# Altium schematic symbol library FPGA_Xilinx_Virtex6.SchLib: 28 symbols (part 8 of 21) (continued)
## XC6VLX75T-FF784 (continued)
part F pins: AA3 MGTREFCLK0N_114 (io), AA4 MGTREFCLK0P_114 (io), AB1 MGTTXP2_114 (io), AB2 MGTTXN2_114 (io), AC3 MGTRXP3_114 (io), AC4 MGTRXN3_114 (io), AD1 MGTTXP1_114 (io), AD2 MGTTXN1_114 (io), AE3 MGTRXP2_114 (io), AE4 MGTRXN2_114 (io), AF1 MGTTXP0_114 (io), AF2 MGTTXN0_114 (io), AG3 MGTRXP1_114 (io), AG4 MGTRXN1_114 (io), AH1 MGTRXP0_114 (io), AH2 MGTRXN0_114 (io), L3 MGTRXP3_115 (io), L4 MGTRXN3_115 (io), M1 MGTTXP3_115 (io), M2 MGTTXN3_115 (io), N3 MGTRXP2_115 (io), N4 MGTRXN2_115 (io), P1 MGTTXP2_115 (io), P2 MGTTXN2_115 (io), P5 MGTREFCLK1N_115 (io), P6 MGTREFCLK1P_115 (io), R3 MGTRXP1_115 (io), R4 MGTRXN1_115 (io), T1 MGTTXP1_115 (io), T2 MGTTXN1_115 (io), T5 MGTREFCLK0N_115 (io), T6 MGTREFCLK0P_115 (io), U3 MGTRXP0_115 (io), U4 MGTRXN0_115 (io), V1 MGTTXP0_115 (io), V2 MGTTXN0_115 (io), W3 MGTREFCLK1N_114 (io), W4 MGTREFCLK1P_114 (io), Y1 MGTTXP3_114 (io), Y2 MGTTXN3_114 (io)
part G pins: A3 MGTRXP3_116 (io), A4 MGTRXN3_116 (io), B1 MGTRXP2_116 (io), B2 MGTRXN2_116 (io), C3 MGTRXP1_116 (io), C4 MGTRXN1_116 (io), D1 MGTTXP3_116 (io), D2 MGTTXN3_116 (io), E3 MGTRXP0_116 (io), E4 MGTRXN0_116 (io), F1 MGTTXP2_116 (io), F2 MGTTXN2_116 (io), G3 MGTREFCLK1N_116 (io), G4 MGTREFCLK1P_116 (io), H1 MGTTXP1_116 (io), H2 MGTTXN1_116 (io), J3 MGTREFCLK0N_116 (io), J4 MGTREFCLK0P_116 (io), K1 MGTTXP0_116 (io), K2 MGTTXN0_116 (io)
part H pins: A5 MGTAVTTRCAL_115 (power), AB4 MGTAVCC (power), AC2 MGTAVTT (power), AE2 MGTAVTT (power), AF4 MGTAVCC (power), AG2 MGTAVTT (power), AH4 MGTAVCC (power), B5 MGTRREF_115 (power), C2 MGTAVTT (power), D4 MGTAVCC (power), E2 MGTAVTT (power), F4 MGTAVCC (power), K4 MGTAVCC (power), L2 MGTAVTT (power), M4 MGTAVCC (power), N2 MGTAVTT (power), P4 MGTAVCC (power), R2 MGTAVTT (power), U2 MGTAVTT (power), V4 MGTAVCC (power), Y4 MGTAVCC (power)
part I pins: AA6 TDI_0 (io), AB6 TCK_0 (io), AF6 DOUT_BUSY_0 (io), AG6 CSI_B_0 (io), AH6 CCLK_0 (io), C6 M2_0 (io), D6 M1_0 (io), F6 M0_0 (io), G6 RDWR_B_0 (io), H6 DIN_0 (io), L6 DONE_0 (io), M6 INIT_B_0 (io), M7 PROGRAM_B_0 (io), N7 HSWAPEN_0 (io), P13 VREFN_0 (io), P14 VP_0 (io), R13 VN_0 (io), R14 VREFP_0 (io), T13 DXN_0 (io), T14 DXP_0 (io), W7 VCCO_0 (power), Y6 TMS_0 (io), Y7 TDO_0 (io), Y8 VCCO_0 (power)
part J pins: A1 GND (power), A2 GND (power), A6 GND (power), A8 GND (power), A18 GND (power), A28 GND (power), AD6 VFS_0 (power), B3 GND (power), B4 GND (power), B6 GND (power), B15 GND (power), B25 GND (power), C1 GND (power), C5 GND (power), C12 GND (power), C22 GND (power), D3 GND (power), D5 GND (power), D9 GND (power), D19 GND (power), E1 GND (power), E5 GND (power), E6 GND (power), E16 GND (power), E26 GND (power), F3 GND (power), F5 GND (power), F13 GND (power), F23 GND (power), G1 GND (power), G2 GND (power), G5 GND (power), G10 GND (power), G20 GND (power), H3 GND (power), H4 GND (power), H5 GND (power), H7 GND (power), H17 GND (power), H27 GND (power), J1 GND (power), J2 GND (power), J5 GND (power), J6 VBATT_0 (power), J14 GND (power), J24 GND (power), K3 GND (power), K5 GND (power), K6 GND (power), K8 VCCAUX (power), K11 GND (power), K12 VCCINT (power), K14 VCCINT (power), K16 VCCINT (power), K20 VCCAUX (power), K21 GND (power), L1 GND (power), L5 GND (power), L8 GND (power), L9 VCCINT (power), L10 GND (power), L11 VCCINT (power), L12 GND (power), L13 VCCINT (power), L14 GND (power), L15 VCCINT (power), L16 GND (power), L17 VCCINT (power), L18 GND (power), L19 VCCAUX (power), L28 GND (power), M3 GND (power), M5 GND (power), M8 VCCAUX (power), M9 GND (power), M10 VCCINT (power), M11 GND (power), M12 VCCINT (power), M13 GND (power), M14 VCCINT (power), M15 GND (power), M16 VCCINT (power), M17 GND (power), M18 VCCINT (power), M25 GND (power), N1 GND (power), N5 GND (power), N6 GND (power), N8 GND (power), N9 VCCINT (power), N10 GND (power), N11 VCCINT (power), N12 GND (power), N13 AVSS_0 (power), N14 AVDD_0 (power), N15 VCCINT (power), N16 GND (power), N17 VCCINT (power), N18 GND (power), N19 VCCAUX (power), N22 GND (power), P3 GND (power), P7 GND (power), P8 VCCAUX (power), P9 GND (power), P10 VCCINT (power), P11 GND (power), P12 VCCINT (power), P15 GND (power), P16 VCCINT (power), P17 GND (power), P18 VCCINT (power), P19 GND (power), R1 GND (power), R5 GND (power), R6 GND (power), R7 GND (power), R8 GND (power), R9 VCCINT (power), R10 GND (power), R11 VCCINT (power), R12 GND (power), R15 VCCINT (power), R16 GND (power), R17 VCCINT (power), R18 GND (power), R19 VCCAUX (power), R26 GND (power), T3 GND (power), T4 GND (power), T7 GND (power), T8 VCCAUX (power), T9 GND (power), T10 VCCINT (power), T11 GND (power), T12 VCCINT (power), T15 GND (power), T16 VCCINT (power), T17 GND (power), T18 VCCINT (power), T19 GND (power), T20 VCCAUX (power), U9 VCCAUX (power), U11 VCCINT (power), U13 VCCINT (power), U15 VCCINT (power), U17 VCCINT (power), U19 VCCAUX (power), V8 VCCAUX (power), V10 VCCINT (power), V12 VCCINT (power), V14 VCCINT (power), V16 VCCINT (power), V18 VCCINT (power), W13 VCCINT (power), W15 VCCINT (power), W17 VCCINT (power), W20 VCCAUX (power)
part K pins: AA1 GND (power), AA2 GND (power), AA5 GND (power), AA8 GND (power), AA18 GND (power), AA28 GND (power), AB3 GND (power), AB5 GND (power), AB15 GND (power), AB25 GND (power), AC1 GND (power), AC5 GND (power), AC6 GND (power), AC12 GND (power), AC22 GND (power), AD3 GND (power), AD4 GND (power), AD5 GND (power), AD9 GND (power), AD19 GND (power), AE1 GND (power), AE5 GND (power), AE6 GND (power), AE16 GND (power), AE26 GND (power), AF3 GND (power), AF5 GND (power), AF13 GND (power), AF23 GND (power), AG1 GND (power), AG5 GND (power), AG10 GND (power), AG20 GND (power), AH3 GND (power), AH5 GND (power), AH7 GND (power), AH17 GND (power), AH27 GND (power), T23 GND (power), U1 GND (power), U5 GND (power), U6 GND (power), U7 GND (power), U8 GND (power), U10 GND (power), U12 GND (power), U14 GND (power), U16 GND (power), U18 GND (power), U20 GND (power), V3 GND (power), V5 GND (power), V6 GND (power), V7 GND (power), V9 GND (power), V11 GND (power), V13 GND (power), V15 GND (power), V17 GND (power), V27 GND (power), W1 GND (power), W2 GND (power), W5 GND (power), W6 GND (power), W14 GND (power), W24 GND (power), Y3 GND (power), Y5 GND (power), Y11 GND (power), Y21 GND (power)

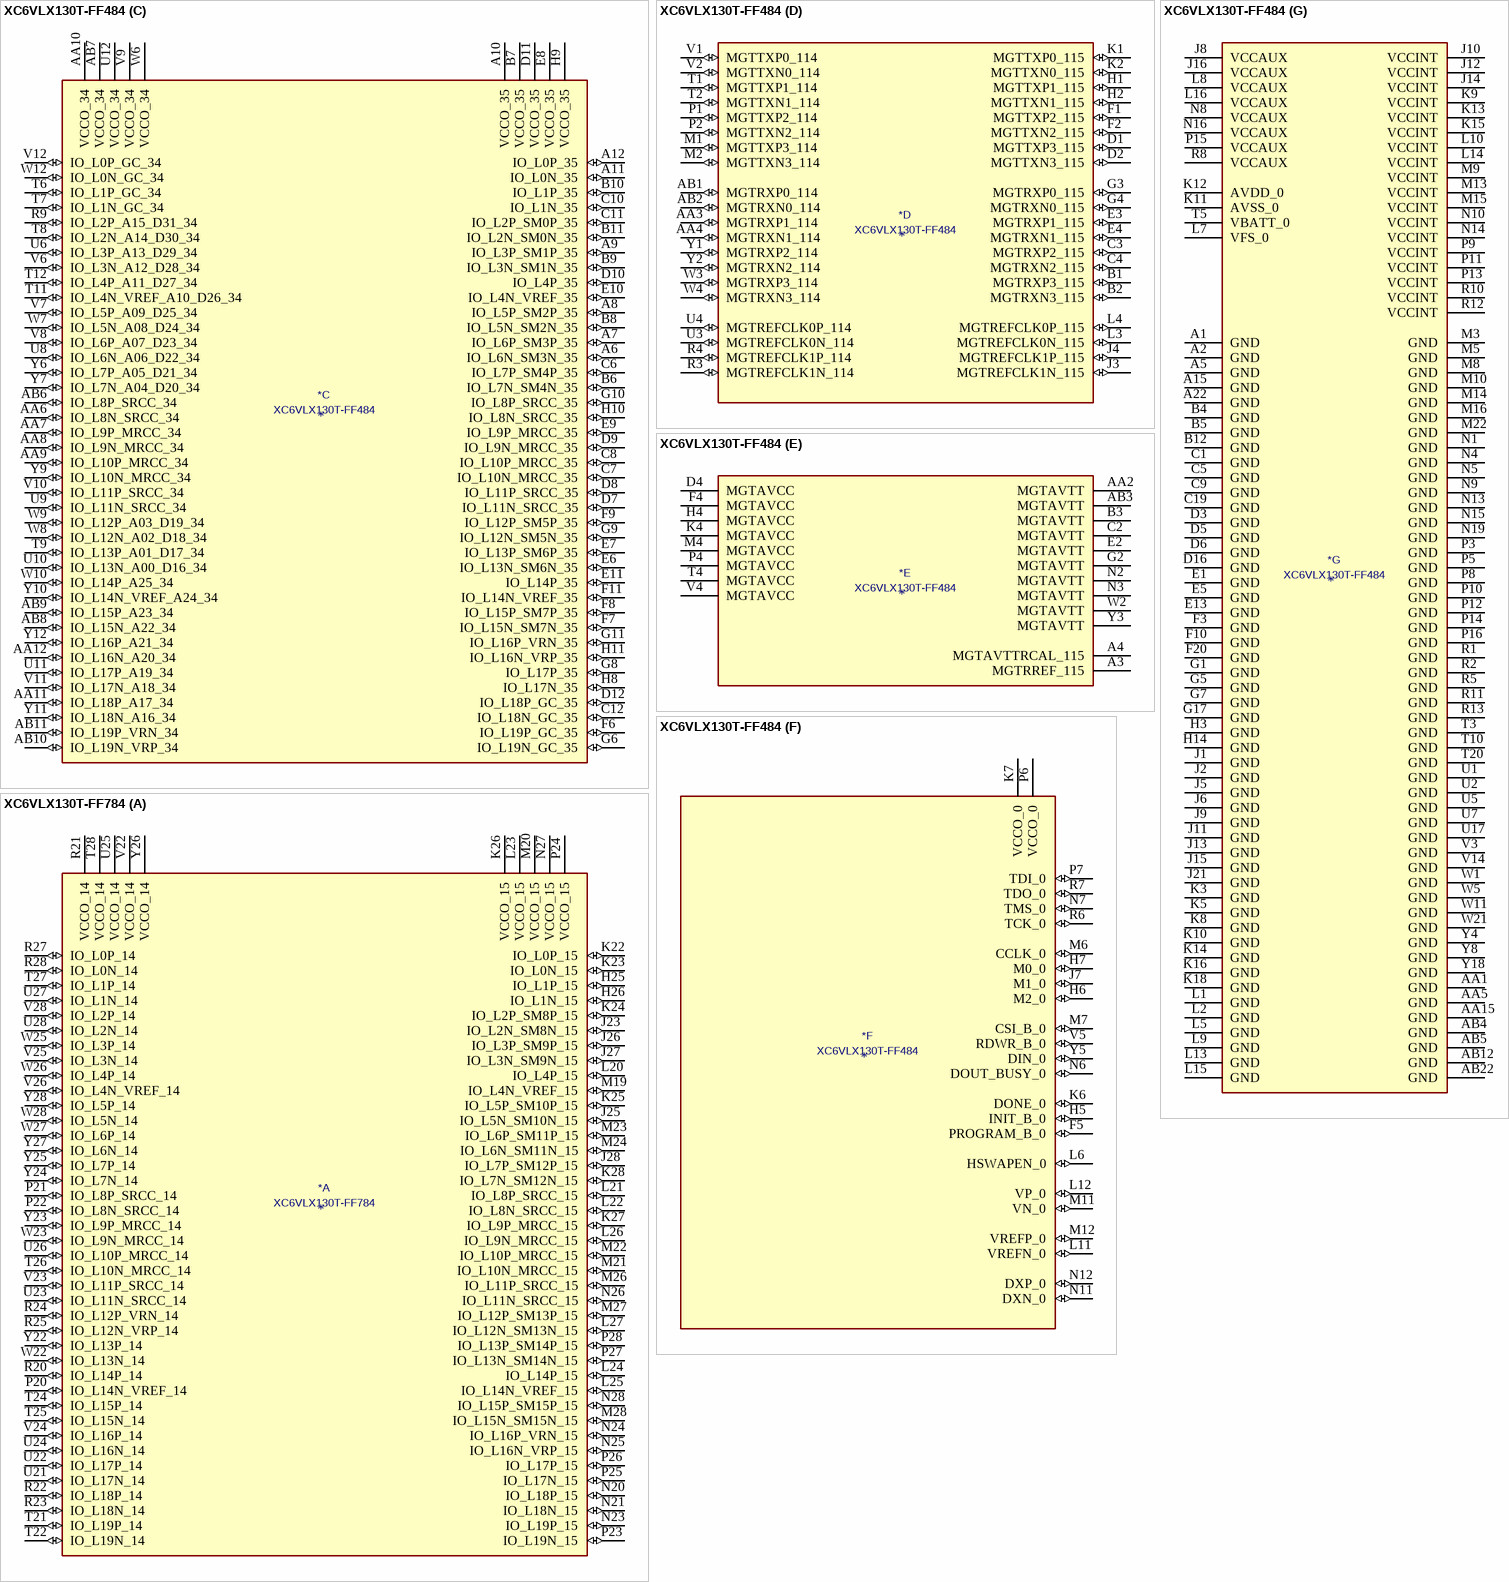
[diagram p38: symbols XC6VLX130T-FF484 to XC6VLX130T-FF784]

## XC6VLX130T-FF484
designator *  value XC6VLX130T-FF484
ki_keywords: FPGA; ki_description: Virtex 6 LXT 130 XC6VLX130T-FF484
part A pins: A20 VCCO_15 (power), A21 IO_L2P_SM8P_15 (io), AA20 VCCO_14 (power), AA21 IO_L15P_14 (io), AA22 IO_L14N_VREF_14 (io), AB20 IO_L16P_14 (io), AB21 IO_L16N_14 (io), B20 IO_L0P_15 (io), B21 IO_L2N_SM8N_15 (io), B22 IO_L5P_SM10P_15 (io), C20 IO_L0N_15 (io), C21 IO_L5N_SM10N_15 (io), C22 IO_L10P_MRCC_15 (io), D19 IO_L7N_SM12N_15 (io), D20 IO_L9P_MRCC_15 (io), D21 VCCO_15 (power), D22 IO_L10N_MRCC_15 (io), E19 IO_L7P_SM12P_15 (io), E20 IO_L9N_MRCC_15 (io), E21 IO_L11P_SRCC_15 (io), E22 IO_L11N_SRCC_15 (io), F18 IO_L1N_15 (io), F19 IO_L3N_SM9N_15 (io), F21 IO_L12P_SM13P_15 (io), F22 IO_L12N_SM13N_15 (io), G18 IO_L1P_15 (io), G19 IO_L3P_SM9P_15 (io), G20 IO_L17N_15 (io), G21 IO_L15P_SM15P_15 (io), G22 VCCO_15 (power), H17 IO_L14P_15 (io), H18 IO_L14N_VREF_15 (io), H19 VCCO_15 (power), H20 IO_L17P_15 (io), H21 IO_L15N_SM15N_15 (io), H22 IO_L18N_15 (io), J17 IO_L4N_VREF_15 (io), J18 IO_L4P_15 (io), J19 IO_L8N_SRCC_15 (io), J20 IO_L13P_SM14P_15 (io), J22 IO_L18P_15 (io), K17 IO_L6P_SM11P_15 (io), K19 IO_L8P_SRCC_15 (io), K20 IO_L13N_SM14N_15 (io), K21 IO_L19P_15 (io), K22 IO_L19N_15 (io), L17 IO_L6N_SM11N_15 (io), L18 IO_L16P_VRN_15 (io), L19 IO_L16N_VRP_15 (io), L20 VCCO_15 (power), L21 IO_L3N_14 (io), L22 IO_L3P_14 (io), M17 VCCO_14 (power), M18 IO_L0P_14 (io), M19 IO_L1N_14 (io), M20 IO_L1P_14 (io), M21 IO_L7P_14 (io), N17 IO_L6P_14 (io), N18 IO_L0N_14 (io), N20 IO_L7N_14 (io), N21 IO_L2N_14 (io), N22 IO_L2P_14 (io), P17 IO_L6N_14 (io), P18 IO_L12P_VRN_14 (io), P19 IO_L9P_MRCC_14 (io), P20 IO_L9N_MRCC_14 (io), P21 VCCO_14 (power), P22 IO_L4P_14 (io), R17 IO_L12N_VRP_14 (io), R18 VCCO_14 (power), R19 IO_L11P_SRCC_14 (io), R20 IO_L11N_SRCC_14 (io), R21 IO_L5P_14 (io), R22 IO_L4N_VREF_14 (io), T18 IO_L17P_14 (io), T19 IO_L17N_14 (io), T21 IO_L8N_SRCC_14 (io), T22 IO_L5N_14 (io), U19 IO_L13P_14 (io), U20 IO_L13N_14 (io), U21 IO_L8P_SRCC_14 (io), U22 VCCO_14 (power), V20 IO_L19P_14 (io), V21 IO_L19N_14 (io), V22 IO_L10N_MRCC_14 (io), W20 IO_L18N_14 (io), W22 IO_L10P_MRCC_14 (io), Y20 IO_L18P_14 (io), Y21 IO_L15N_14 (io), Y22 IO_L14P_14 (io)
part B pins: A13 IO_L12P_25 (io), A14 IO_L2P_25 (io), A16 IO_L5P_25 (io), A17 IO_L7P_25 (io), A18 IO_L7N_25 (io), A19 IO_L10P_MRCC_25 (io), AA13 IO_L16N_CSO_B_24 (io), AA14 IO_L18N_24 (io), AA16 IO_L11P_SRCC_24 (io), AA17 IO_L10N_MRCC_24 (io), AA18 IO_L8N_SRCC_24 (io), AA19 IO_L9P_MRCC_24 (io), AB13 IO_L16P_RS0_24 (io), AB14 IO_L18P_24 (io), AB15 IO_L19P_24 (io), AB16 IO_L19N_24 (io), AB17 VCCO_24 (power), AB18 IO_L8P_SRCC_24 (io), AB19 IO_L9N_MRCC_24 (io), B13 IO_L12N_25 (io), B14 IO_L2N_25 (io), B15 IO_L1P_25 (io), B16 IO_L5N_25 (io), B17 VCCO_25 (power), B18 IO_L13P_25 (io), B19 IO_L10N_MRCC_25 (io), C13 IO_L8P_SRCC_25 (io), C14 VCCO_25 (power), C15 IO_L1N_25 (io), C16 IO_L11P_SRCC_25 (io), C17 IO_L11N_SRCC_25 (io), C18 IO_L13N_25 (io), D13 IO_L8N_SRCC_25 (io), D14 IO_L0P_25 (io), D15 IO_L3P_25 (io), D17 IO_L17P_25 (io), D18 IO_L17N_25 (io), E12 IO_L6N_25 (io), E14 IO_L0N_25 (io), E15 IO_L3N_25 (io), E16 IO_L9P_MRCC_25 (io), E17 IO_L19P_GC_25 (io), E18 VCCO_25 (power), F12 IO_L6P_25 (io), F13 IO_L4P_25 (io), F14 IO_L14N_VREF_25 (io), F15 VCCO_25 (power), F16 IO_L9N_MRCC_25 (io), F17 IO_L19N_GC_25 (io), G12 VCCO_25 (power), G13 IO_L4N_VREF_25 (io), G14 IO_L14P_25 (io), G15 IO_L18P_GC_25 (io), G16 IO_L15P_25 (io), H12 IO_L16P_VRN_25 (io), H13 IO_L16N_VRP_25 (io), H15 IO_L18N_GC_25 (io), H16 IO_L15N_25 (io), R14 IO_L12P_D3_24 (io), R15 IO_L12N_D2_FS2_24 (io), R16 IO_L2N_D14_24 (io), T13 IO_L0P_GC_24 (io), T14 IO_L15P_FWE_B_24 (io), T15 VCCO_24 (power), T16 IO_L2P_D15_24 (io), T17 IO_L1P_GC_24 (io), U13 IO_L0N_GC_24 (io), U14 IO_L15N_RS1_24 (io), U15 IO_L13P_D1_FS1_24 (io), U16 IO_L6N_D6_24 (io), U18 IO_L1N_GC_24 (io), V13 IO_L4P_D11_24 (io), V15 IO_L13N_D0_FS0_24 (io), V16 IO_L6P_D7_24 (io), V17 IO_L3P_D13_24 (io), V18 IO_L3N_D12_24 (io), V19 VCCO_24 (power), W13 IO_L4N_VREF_D10_24 (io), W14 IO_L17N_VRP_24 (io), W15 IO_L14P_FCS_B_24 (io), W16 VCCO_24 (power), W17 IO_L5N_D8_24 (io), W18 IO_L5P_D9_24 (io), W19 IO_L7P_D5_24 (io), Y13 VCCO_24 (power), Y14 IO_L17P_VRN_24 (io), Y15 IO_L14N_VREF_FOE_B_MOSI_24 (io), Y16 IO_L11N_SRCC_24 (io), Y17 IO_L10P_MRCC_24 (io), Y19 IO_L7N_D4_24 (io)
part C pins: A6 IO_L6N_SM3N_35 (io), A7 IO_L6P_SM3P_35 (io), A8 IO_L5P_SM2P_35 (io), A9 IO_L3P_SM1P_35 (io), A10 VCCO_35 (power), A11 IO_L0N_35 (io), A12 IO_L0P_35 (io), AA6 IO_L8N_SRCC_34 (io), AA7 IO_L9P_MRCC_34 (io), AA8 IO_L9N_MRCC_34 (io), AA9 IO_L10P_MRCC_34 (io), AA10 VCCO_34 (power), AA11 IO_L18P_A17_34 (io), AA12 IO_L16N_A20_34 (io), AB6 IO_L8P_SRCC_34 (io), AB7 VCCO_34 (power), AB8 IO_L15N_A22_34 (io), AB9 IO_L15P_A23_34 (io), AB10 IO_L19N_VRP_34 (io), AB11 IO_L19P_VRN_34 (io), B6 IO_L7N_SM4N_35 (io), B7 VCCO_35 (power), B8 IO_L5N_SM2N_35 (io), B9 IO_L3N_SM1N_35 (io), B10 IO_L1P_35 (io), B11 IO_L2N_SM0N_35 (io), C6 IO_L7P_SM4P_35 (io), C7 IO_L10N_MRCC_35 (io), C8 IO_L10P_MRCC_35 (io), C10 IO_L1N_35 (io), C11 IO_L2P_SM0P_35 (io), C12 IO_L18N_GC_35 (io), D7 IO_L11N_SRCC_35 (io), D8 IO_L11P_SRCC_35 (io), D9 IO_L9N_MRCC_35 (io), D10 IO_L4P_35 (io), D11 VCCO_35 (power), D12 IO_L18P_GC_35 (io), E6 IO_L13N_SM6N_35 (io), E7 IO_L13P_SM6P_35 (io), E8 VCCO_35 (power), E9 IO_L9P_MRCC_35 (io), E10 IO_L4N_VREF_35 (io), E11 IO_L14P_35 (io), F6 IO_L19P_GC_35 (io), F7 IO_L15N_SM7N_35 (io), F8 IO_L15P_SM7P_35 (io), F9 IO_L12P_SM5P_35 (io), F11 IO_L14N_VREF_35 (io), G6 IO_L19N_GC_35 (io), G8 IO_L17P_35 (io), G9 IO_L12N_SM5N_35 (io), G10 IO_L8P_SRCC_35 (io), G11 IO_L16P_VRN_35 (io), H8 IO_L17N_35 (io), H9 VCCO_35 (power), H10 IO_L8N_SRCC_35 (io), H11 IO_L16N_VRP_35 (io), R9 IO_L2P_A15_D31_34 (io), T6 IO_L1P_GC_34 (io), T7 IO_L1N_GC_34 (io), T8 IO_L2N_A14_D30_34 (io), T9 IO_L13P_A01_D17_34 (io), T11 IO_L4N_VREF_A10_D26_34 (io), T12 IO_L4P_A11_D27_34 (io), U6 IO_L3P_A13_D29_34 (io), U8 IO_L6N_A06_D22_34 (io), U9 IO_L11N_SRCC_34 (io), U10 IO_L13N_A00_D16_34 (io), U11 IO_L17P_A19_34 (io), U12 VCCO_34 (power), V6 IO_L3N_A12_D28_34 (io), V7 IO_L5P_A09_D25_34 (io), V8 IO_L6P_A07_D23_34 (io), V9 VCCO_34 (power), V10 IO_L11P_SRCC_34 (io), V11 IO_L17N_A18_34 (io), V12 IO_L0P_GC_34 (io), W6 VCCO_34 (power), W7 IO_L5N_A08_D24_34 (io), W8 IO_L12N_A02_D18_34 (io), W9 IO_L12P_A03_D19_34 (io), W10 IO_L14P_A25_34 (io), W12 IO_L0N_GC_34 (io), Y6 IO_L7P_A05_D21_34 (io), Y7 IO_L7N_A04_D20_34 (io), Y9 IO_L10N_MRCC_34 (io), Y10 IO_L14N_VREF_A24_34 (io), Y11 IO_L18N_A16_34 (io), Y12 IO_L16P_A21_34 (io)
part D pins: AA3 MGTRXP1_114 (io), AA4 MGTRXN1_114 (io), AB1 MGTRXP0_114 (io), AB2 MGTRXN0_114 (io), B1 MGTRXP3_115 (io), B2 MGTRXN3_115 (io), C3 MGTRXP2_115 (io), C4 MGTRXN2_115 (io), D1 MGTTXP3_115 (io), D2 MGTTXN3_115 (io), E3 MGTRXP1_115 (io), E4 MGTRXN1_115 (io), F1 MGTTXP2_115 (io), F2 MGTTXN2_115 (io), G3 MGTRXP0_115 (io), G4 MGTRXN0_115 (io), H1 MGTTXP1_115 (io), H2 MGTTXN1_115 (io), J3 MGTREFCLK1N_115 (io), J4 MGTREFCLK1P_115 (io), K1 MGTTXP0_115 (io), K2 MGTTXN0_115 (io), L3 MGTREFCLK0N_115 (io), L4 MGTREFCLK0P_115 (io), M1 MGTTXP3_114 (io), M2 MGTTXN3_114 (io), P1 MGTTXP2_114 (io), P2 MGTTXN2_114 (io), R3 MGTREFCLK1N_114 (io), R4 MGTREFCLK1P_114 (io), T1 MGTTXP1_114 (io), T2 MGTTXN1_114 (io), U3 MGTREFCLK0N_114 (io), U4 MGTREFCLK0P_114 (io), V1 MGTTXP0_114 (io), V2 MGTTXN0_114 (io), W3 MGTRXP3_114 (io), W4 MGTRXN3_114 (io), Y1 MGTRXP2_114 (io), Y2 MGTRXN2_114 (io)
part E pins: A3 MGTRREF_115 (power), A4 MGTAVTTRCAL_115 (power), AA2 MGTAVTT (power), AB3 MGTAVTT (power), B3 MGTAVTT (power), C2 MGTAVTT (power), D4 MGTAVCC (power), E2 MGTAVTT (power), F4 MGTAVCC (power), G2 MGTAVTT (power), H4 MGTAVCC (power), K4 MGTAVCC (power), M4 MGTAVCC (power), N2 MGTAVTT (power), N3 MGTAVTT (power), P4 MGTAVCC (power), T4 MGTAVCC (power), V4 MGTAVCC (power), W2 MGTAVTT (power), Y3 MGTAVTT (power)
part F pins: F5 PROGRAM_B_0 (io), H5 INIT_B_0 (io), H6 M2_0 (io), H7 M0_0 (io), J7 M1_0 (io), K6 DONE_0 (io), K7 VCCO_0 (power), L6 HSWAPEN_0 (io), L11 VREFN_0 (io), L12 VP_0 (io), M6 CCLK_0 (io), M7 CSI_B_0 (io), M11 VN_0 (io), M12 VREFP_0 (io), N6 DOUT_BUSY_0 (io), N7 TMS_0 (io), N11 DXN_0 (io), N12 DXP_0 (io), P6 VCCO_0 (power), P7 TDI_0 (io), R6 TCK_0 (io), R7 TDO_0 (io), V5 RDWR_B_0 (io), Y5 DIN_0 (io)
part G pins: A1 GND (power), A2 GND (power), A5 GND (power), A15 GND (power), A22 GND (power), AA1 GND (power), AA5 GND (power), AA15 GND (power), AB4 GND (power), AB5 GND (power), AB12 GND (power), AB22 GND (power), B4 GND (power), B5 GND (power), B12 GND (power), C1 GND (power), C5 GND (power), C9 GND (power), C19 GND (power), D3 GND (power), D5 GND (power), D6 GND (power), D16 GND (power), E1 GND (power), E5 GND (power), E13 GND (power), F3 GND (power), F10 GND (power), F20 GND (power), G1 GND (power), G5 GND (power), G7 GND (power), G17 GND (power), H3 GND (power), H14 GND (power), J1 GND (power), J2 GND (power), J5 GND (power), J6 GND (power), J8 VCCAUX (power), J9 GND (power), J10 VCCINT (power), J11 GND (power), J12 VCCINT (power), J13 GND (power), J14 VCCINT (power), J15 GND (power), J16 VCCAUX (power), J21 GND (power), K3 GND (power), K5 GND (power), K8 GND (power), K9 VCCINT (power), K10 GND (power), K11 AVSS_0 (power), K12 AVDD_0 (power), K13 VCCINT (power), K14 GND (power), K15 VCCINT (power), K16 GND (power), K18 GND (power), L1 GND (power), L2 GND (power), L5 GND (power), L7 VFS_0 (power), L8 VCCAUX (power), L9 GND (power), L10 VCCINT (power), L13 GND (power), L14 VCCINT (power), L15 GND (power), L16 VCCAUX (power), M3 GND (power), M5 GND (power), M8 GND (power), M9 VCCINT (power), M10 GND (power), M13 VCCINT (power), M14 GND (power), M15 VCCINT (power), M16 GND (power), M22 GND (power), N1 GND (power), N4 GND (power), N5 GND (power), N8 VCCAUX (power), N9 GND (power), N10 VCCINT (power), N13 GND (power), N14 VCCINT (power), N15 GND (power), N16 VCCAUX (power), N19 GND (power), P3 GND (power), P5 GND (power), P8 GND (power), P9 VCCINT (power), P10 GND (power), P11 VCCINT (power), P12 GND (power), P13 VCCINT (power), P14 GND (power), P15 VCCAUX (power), P16 GND (power), R1 GND (power), R2 GND (power), R5 GND (power), R8 VCCAUX (power), R10 VCCINT (power), R11 GND (power), R12 VCCINT (power), R13 GND (power), T3 GND (power), T5 VBATT_0 (power), T10 GND (power), T20 GND (power), U1 GND (power), U2 GND (power), U5 GND (power), U7 GND (power), U17 GND (power), V3 GND (power), V14 GND (power), W1 GND (power), W5 GND (power), W11 GND (power), W21 GND (power), Y4 GND (power), Y8 GND (power), Y18 GND (power)

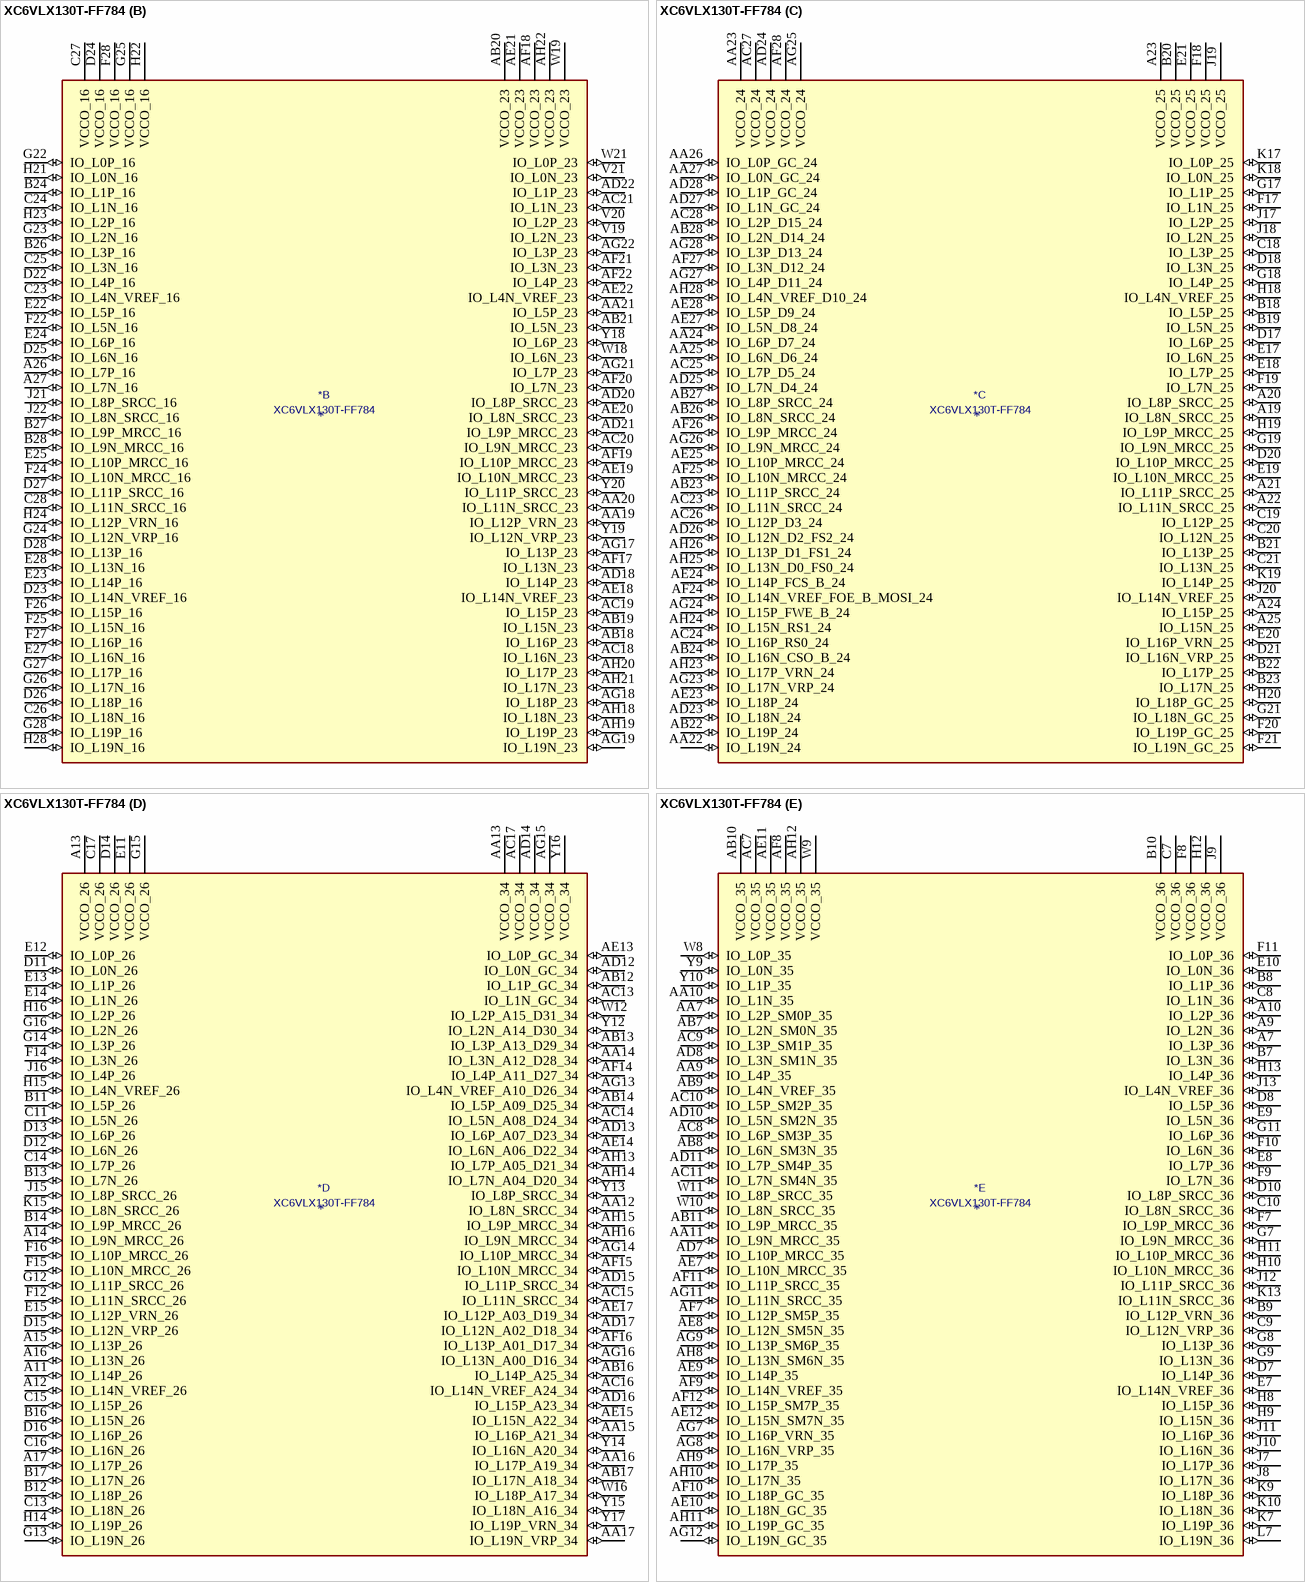
[diagram p39: symbol XC6VLX130T-FF784]

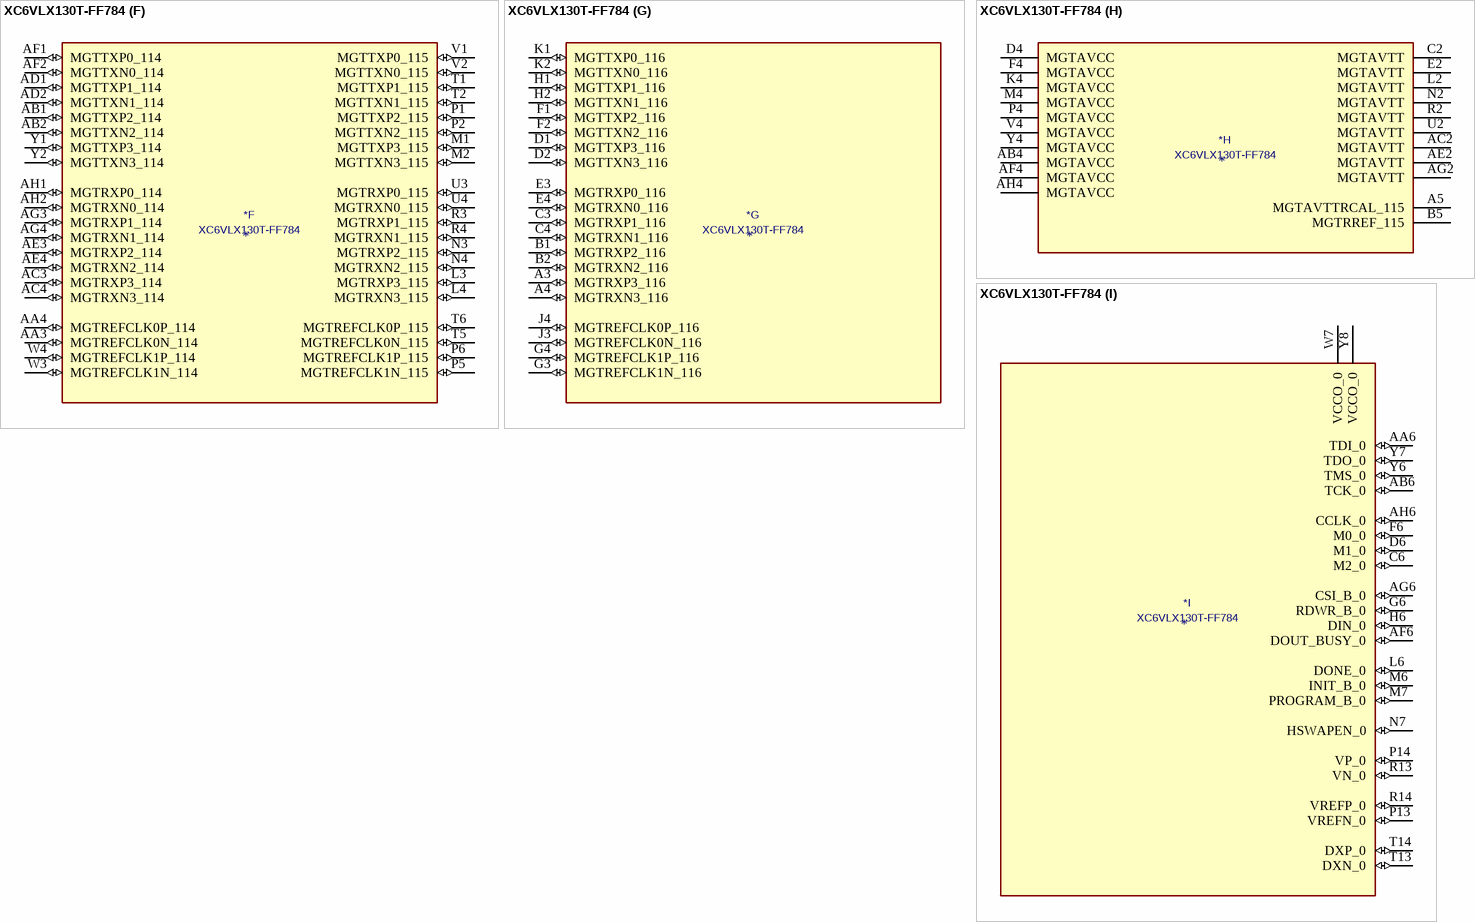
[diagram p40: symbol XC6VLX130T-FF784]

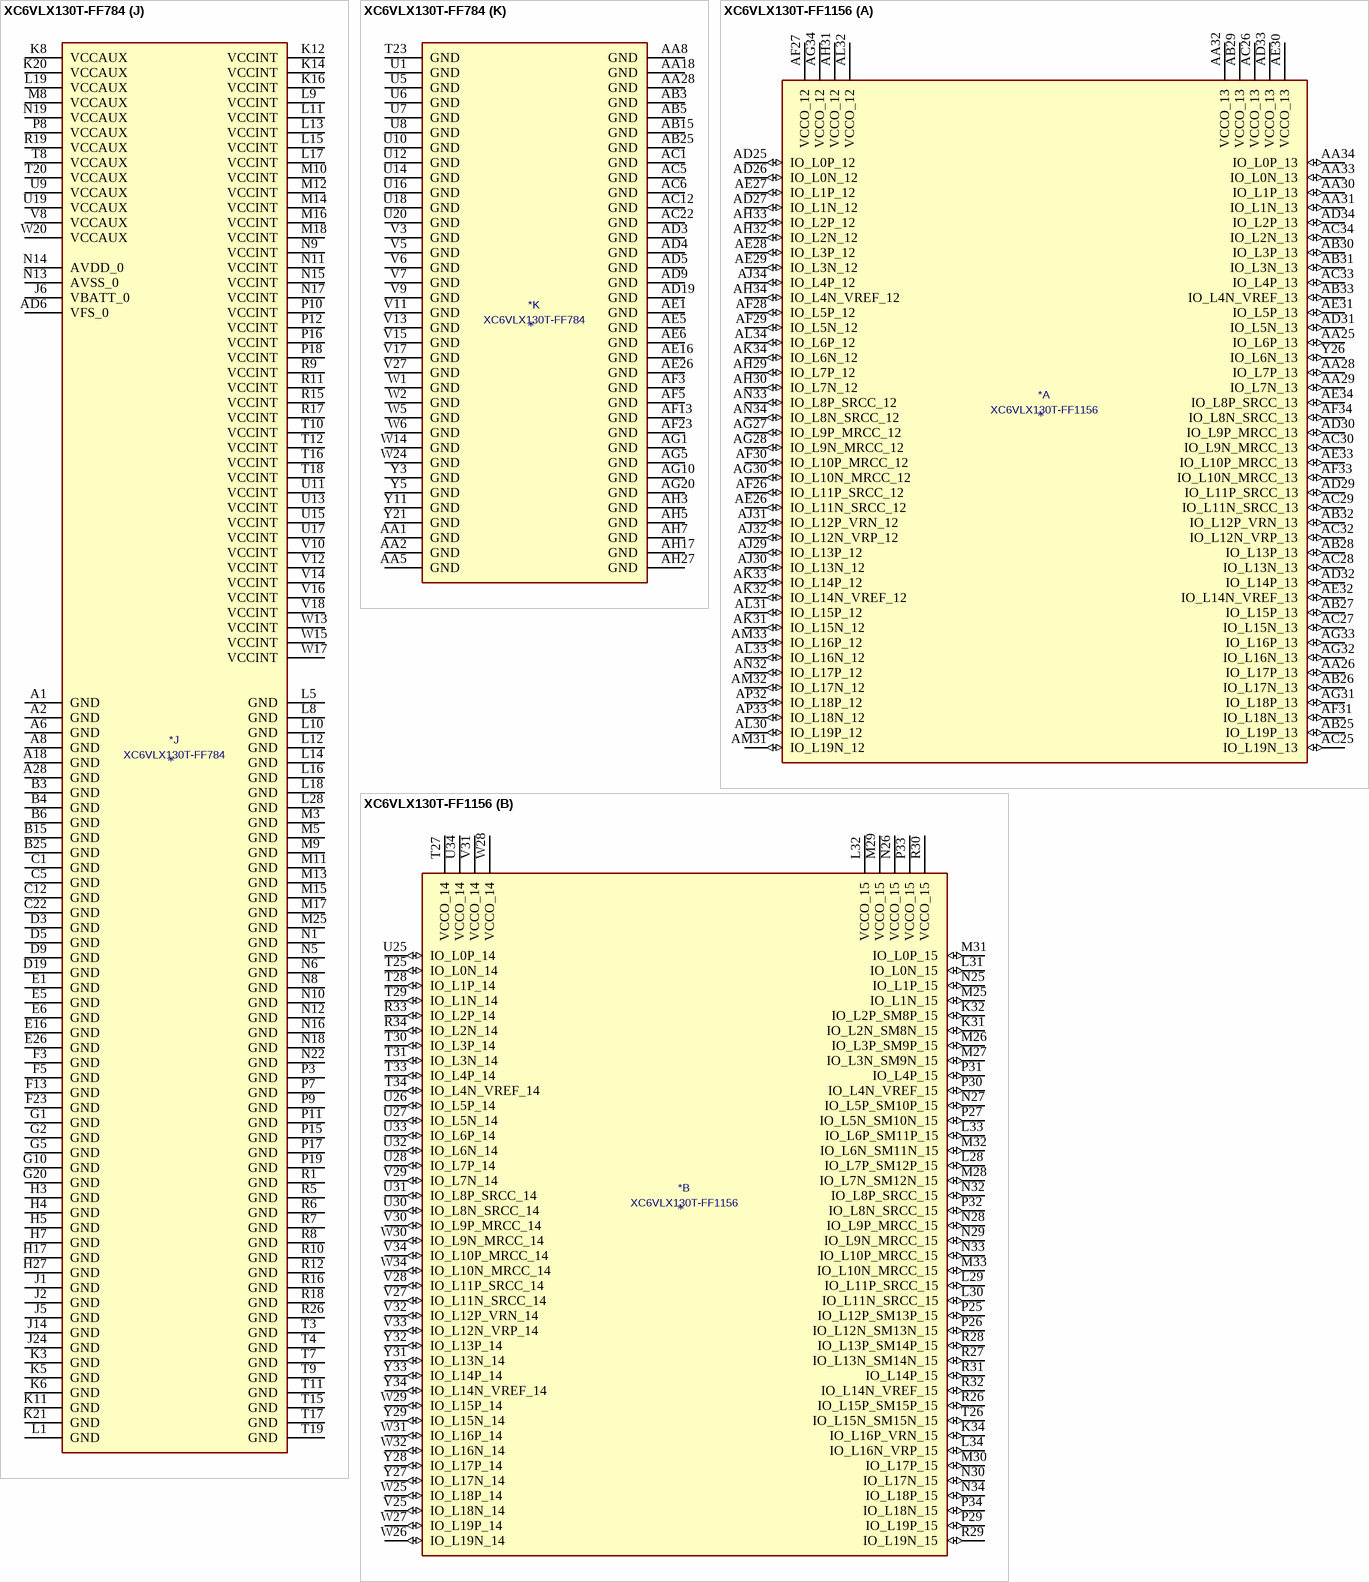
[diagram p41: symbols XC6VLX130T-FF784 to XC6VLX130T-FF1156]